# Altium footprint library PcbLib1.PcbLib: 120 footprints (part 7 of 8)
Each footprint in its own frame and in the unit in brackets; x right, y up, seen from the top. Pads: shape width x height; smd on the part's side, far side on the other; paste and mask are expansions set on the pad; w line width, h text height; cw(c..) or ccw(c..) is an arc to the next point about the centre after c.
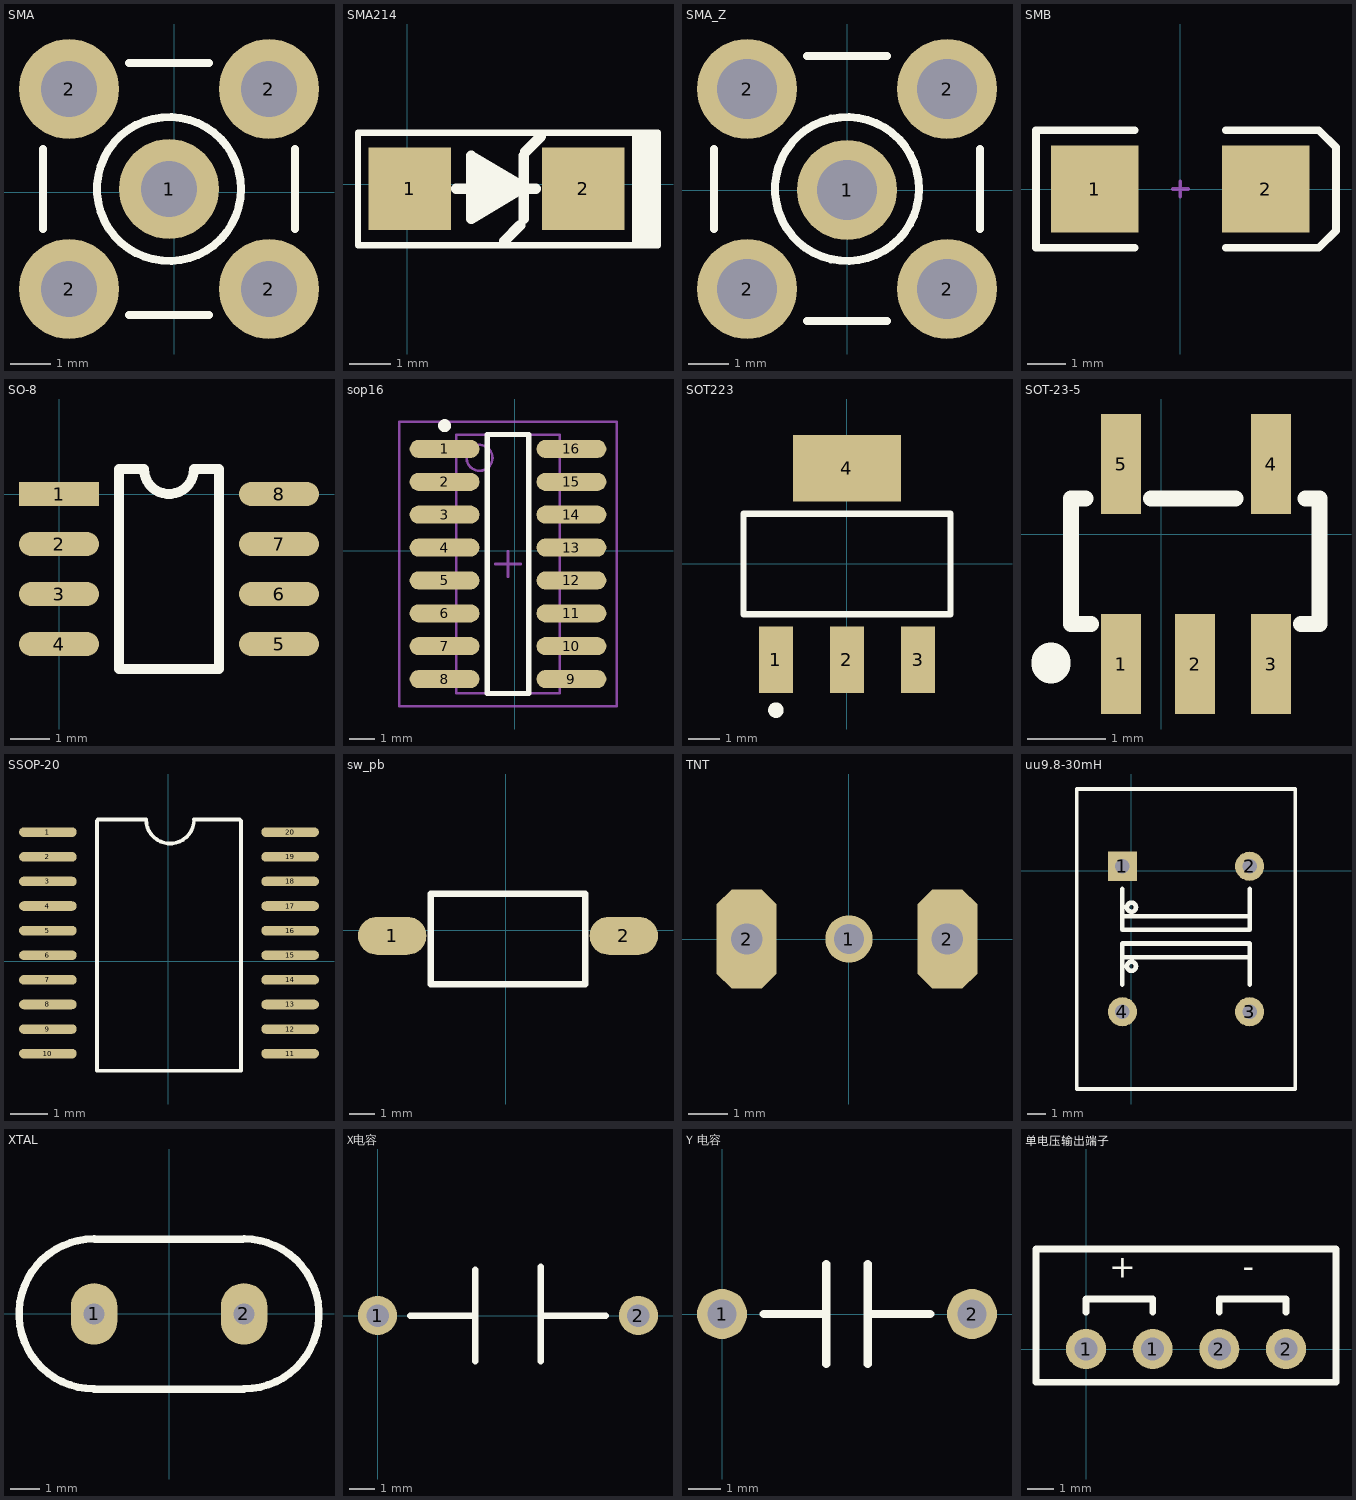
[diagram p6: the footprints below, top view; thin cyan lines are the x and y axes]

## SMA [mm]
pads (5):
  round 2.5 hole 1.397: 1(-0.137,0.082) 2(-2.637,-2.418) 2(-2.637,2.582) 2(2.363,-2.418) 2(2.363,2.582)
Top Overlay:
  circle w0.2: c-0.137,0.082 r1.8
  lines w0.2: -3.287,-0.918 -3.287,1.082 ; -1.137,-3.068 0.863,-3.068 ; -1.137,3.232 0.863,3.232 ; 3.013,-0.918 3.013,1.082
Mechanical 1:
  circle w0.025: c-0.137,0.082 r1.8
  circle w0.025: c-0.137,0.082 r1.05
  circle w0.025: c-0.137,0.082 r0.2

## SMA214 [mm]
height 2
pads (2):
  rect 2x2 smd: 1(0.066,-0.114) 2(4.266,-0.114)
Top Overlay:
  rectangle: 5.511,-1.48 6.07,1.238
  lines w0.152: 5.516,-1.48 5.516,1.238 ; 6.074,-1.124 6.074,0.933 ; -1.19,-1.48 -1.19,1.238 6.074,1.238 6.074,-1.48 -1.19,-1.48
  lines w0.254: 1.191,-0.114 3.116,-0.114 ; 1.683,-0.587 1.683,0.429 ; 1.81,-0.587 1.81,0.429 ; 1.937,-0.46 1.937,0.302 ; 2.064,-0.46 2.064,0.302 ; 2.191,-0.333 2.191,0.175 ; 2.318,-0.333 2.318,0.048 ; 2.352,-1.384 2.733,-1.003 ; 2.826,-0.841 2.826,0.683 ; 2.86,0.775 3.241,1.156 ; 1.556,-0.841 1.556,0.683 2.826,-0.079 1.556,-0.841

## SMA_Z [mm]
pads (5):
  round 2.5 hole 1.5: 1(0,0) 2(-2.5,-2.475) 2(-2.5,2.525) 2(2.5,-2.475) 2(2.5,2.525)
Top Overlay:
  circle w0.203: c0,0.025 r1.8
  lines w0.2: -3.329,-0.975 -3.329,1.025 ; -1,-3.278 1,-3.278 ; -1,3.354 1,3.354 ; 3.329,-0.975 3.329,1.025
Mechanical 1:
  circle w0.025: c0,0.025 r1.8
  circle w0.025: c0,0.025 r1.05
  circle w0.025: c0,0.025 r0.2

## SMB [mm]
pads (2):
  rect 2.3x2.3 smd: 1(-2.25,0) 2(2.25,0)
Top Overlay:
  lines w0.2: -1.2,-1.55 -3.8,-1.55 -3.8,1.55 -1.2,1.55 ; 1.2,-1.55 3.65,-1.55 4.1,-1.1 4.1,1.1 3.65,1.55 1.2,1.55
Mechanical 1:
  lines w0.1: -0.2,0 0.2,0 ; 0,-0.2 0,0.2

## SO-8 [mil]
pads (8):
  rect 80x24 smd: 1(0,0)
  oval 80x24 smd: 2(0,-50) 3(0,-100) 4(0,-150) 5(220,-150) 6(220,-100) 7(220,-50) 8(220,0)
Top Overlay:
  lines w10: 60,-175 60,25 85,25 ccw(c110,25) 135,25 160,25 160,-175 60,-175

## sop16 [mm]
pads (16):
  oval 2.7x0.7 smd: 1(-2.704,3.937) 2(-2.704,2.667) 3(-2.704,1.397) 4(-2.704,0.127) 5(-2.704,-1.143) 6(-2.704,-2.413) 7(-2.704,-3.683) 8(-2.704,-4.953) 9(2.196,-4.953) 10(2.196,-3.683) 11(2.196,-2.413) 12(2.196,-1.143) 13(2.196,0.127) 14(2.196,1.397) 15(2.196,2.667) 16(2.196,3.937)
Top Overlay:
  circle w0.25: c-2.704,4.837 r0.125
  lines w0.2: -1.054,-5.508 -1.054,4.492 0.546,4.492 0.546,-5.508 -1.054,-5.508
Mechanical 13:
  circle w0.1: c-1.354,3.592 r0.5
  lines w0.1: -2.254,-5.508 -2.254,4.492 1.746,4.492 1.746,-5.508 -2.254,-5.508
Mechanical 15:
  lines w0.1: -0.754,-0.508 0.246,-0.508 ; -0.254,-1.008 -0.254,-0.008 ; -4.454,-6.008 -4.454,4.992 3.946,4.992 3.946,-6.008 -4.454,-6.008
3D body: height 1.75, standoff 0, extent -2.254,-5.508 1.746,4.492

## SOT223 [mm] "SOT-223/SC-73; 4 Leads; Body 6.7 x 7.3 mm, inc. leads (LxW max)"
height 1.8
pads (4):
  rect 1.1x2.15 smd: 1(-2.3,-3.1) 2(0,-3.1) 3(2.3,-3.1)
  rect 3.5x2.15 smd: 4(0,3.1)
Top Overlay:
  circle w0.25: c-2.3,-4.725 r0.125
  lines w0.2: -3.35,-1.625 3.35,-1.625 3.35,1.625 -3.35,1.625 -3.35,-1.625

## SOT-23-5 [mil]
pads (5):
  rect 20x50 smd: 1(-20,-65) 2(17,-65) 3(55,-65) 4(55,35) 5(-20,35)
Top Overlay:
  lines w8: -37.76,17.76 -45,17.76 -45,-45 -35,-45 ; -5,17.76 37.24,17.76 ; 70,-45 79.32,-45 79.32,17.76 72.24,17.76
  lines w19.68: -55,-65 -55,-64

## SSOP-20 [mil]
pads (20):
  oval 60x10 smd: 1(-125,134) 2(-125,108.41) 3(-125,82.82) 4(-125,57.23) 5(-125,31.64) 6(-125,6.05) 7(-125,-19.54) 8(-125,-45.13) 9(-125,-70.72) 10(-125,-96.31) 11(126.97,-96.31) 12(126.97,-70.72) 13(126.97,-45.13) 14(126.97,-19.54) 15(126.97,6.05) 16(126.97,31.64) 17(126.97,57.23) 18(126.97,82.82) 19(126.97,108.41) 20(126.97,134)
Top Overlay:
  lines w3.94: -73.82,145.81 -73.82,-114.03 75.79,-114.03 75.79,145.81 74.41,147.19 27.13,147.19 cw(c2.13,147.19) -22.87,147.19 -72.87,147.19

## sw_pb [mm]
pads (2):
  oval 2.7x1.5 smd: 1(-4.484,-0.215) 2(4.66,-0.215)
Top Overlay:
  lines w0.254: -2.96,-2.12 3.136,-2.12 3.136,1.436 -2.96,1.436 -2.96,-2.12

## TNT [mm]
height 2
pads (3):
  round 1.2 hole 0.762: 1(0,0)
  oct 1.524x2.524 hole 0.8: 2(-2.6,0) 2(2.5,0)

## uu9.8-30mH [mm]
pads (4):
  rect 1.6x1.6 hole 0.8: 1(-0.5,0.25)
  round 1.6 hole 0.8: 2(6.5,0.25) 3(6.5,-7.75) 4(-0.5,-7.75)
Top Overlay:
  circle w0.254: c0,-2 r0.25
  circle w0.254: c0,-5.25 r0.25
  lines w0.2: -3,-12 9,-12 9,4.5 -3,4.5 -3,-12
  lines w0.254: -0.5,-6.25 -0.5,-4 6.5,-4 6.5,-6.25 ; -0.5,-4.75 6.5,-4.75 ; -0.5,-2.5 6.5,-2.5 ; -0.5,-1 -0.5,-3.25 6.5,-3.25 6.5,-1

## XTAL [mil]
pads (2):
  oval 62x82 hole 28: 1(-100,0) 2(100,0)
Top Overlay:
  lines w10: -100,-100.39 99.8,-100.39 ; -100,-100 cw(c-100,0) -100,100 ; -99.02,99.41 98.62,99.37 ; 100,-100 ccw(c100,0) 100,100

## X电容 [mil]
pads (2):
  round 60 hole 34.65: 1(0,0) 2(400,0)
Top Overlay:
  lines w10: 50,0 150,0 ; 150,-70 150,70 ; 250,-70 250,75 ; 250,0 350,0

## Y 电容 [mil]
pads (2):
  round 60 hole 34.65: 1(0,0) 2(300,0)
Top Overlay:
  lines w10: 50,0 125,0 ; 125,-60 125,60 ; 175,-60 175,60 ; 175,0 250,0

## 单电压输出端子 [mil]
pads (4):
  round 60 hole 34.65: 1(0,0) 1(100,0) 2(200,0) 2(300,0)
Top Overlay:
  lines w10: 0,55 0,75 100,75 100,55 ; 200,55 200,75 300,75 300,55 ; -75,-50 -75,150 375,150 375,-50 -75,-50
  text "+" at 35,95 h60
  text "-" at 235,95 h60